# Altium footprint library PART.PcbLib: 407 footprints (part 18 of 26)
Each footprint in its own frame and in the unit in brackets; x right, y up, seen from the top. Pads: shape width x height; smd on the part's side, far side on the other; paste and mask are expansions set on the pad; w line width, h text height; cw(c..) or ccw(c..) is an arc to the next point about the centre after c.
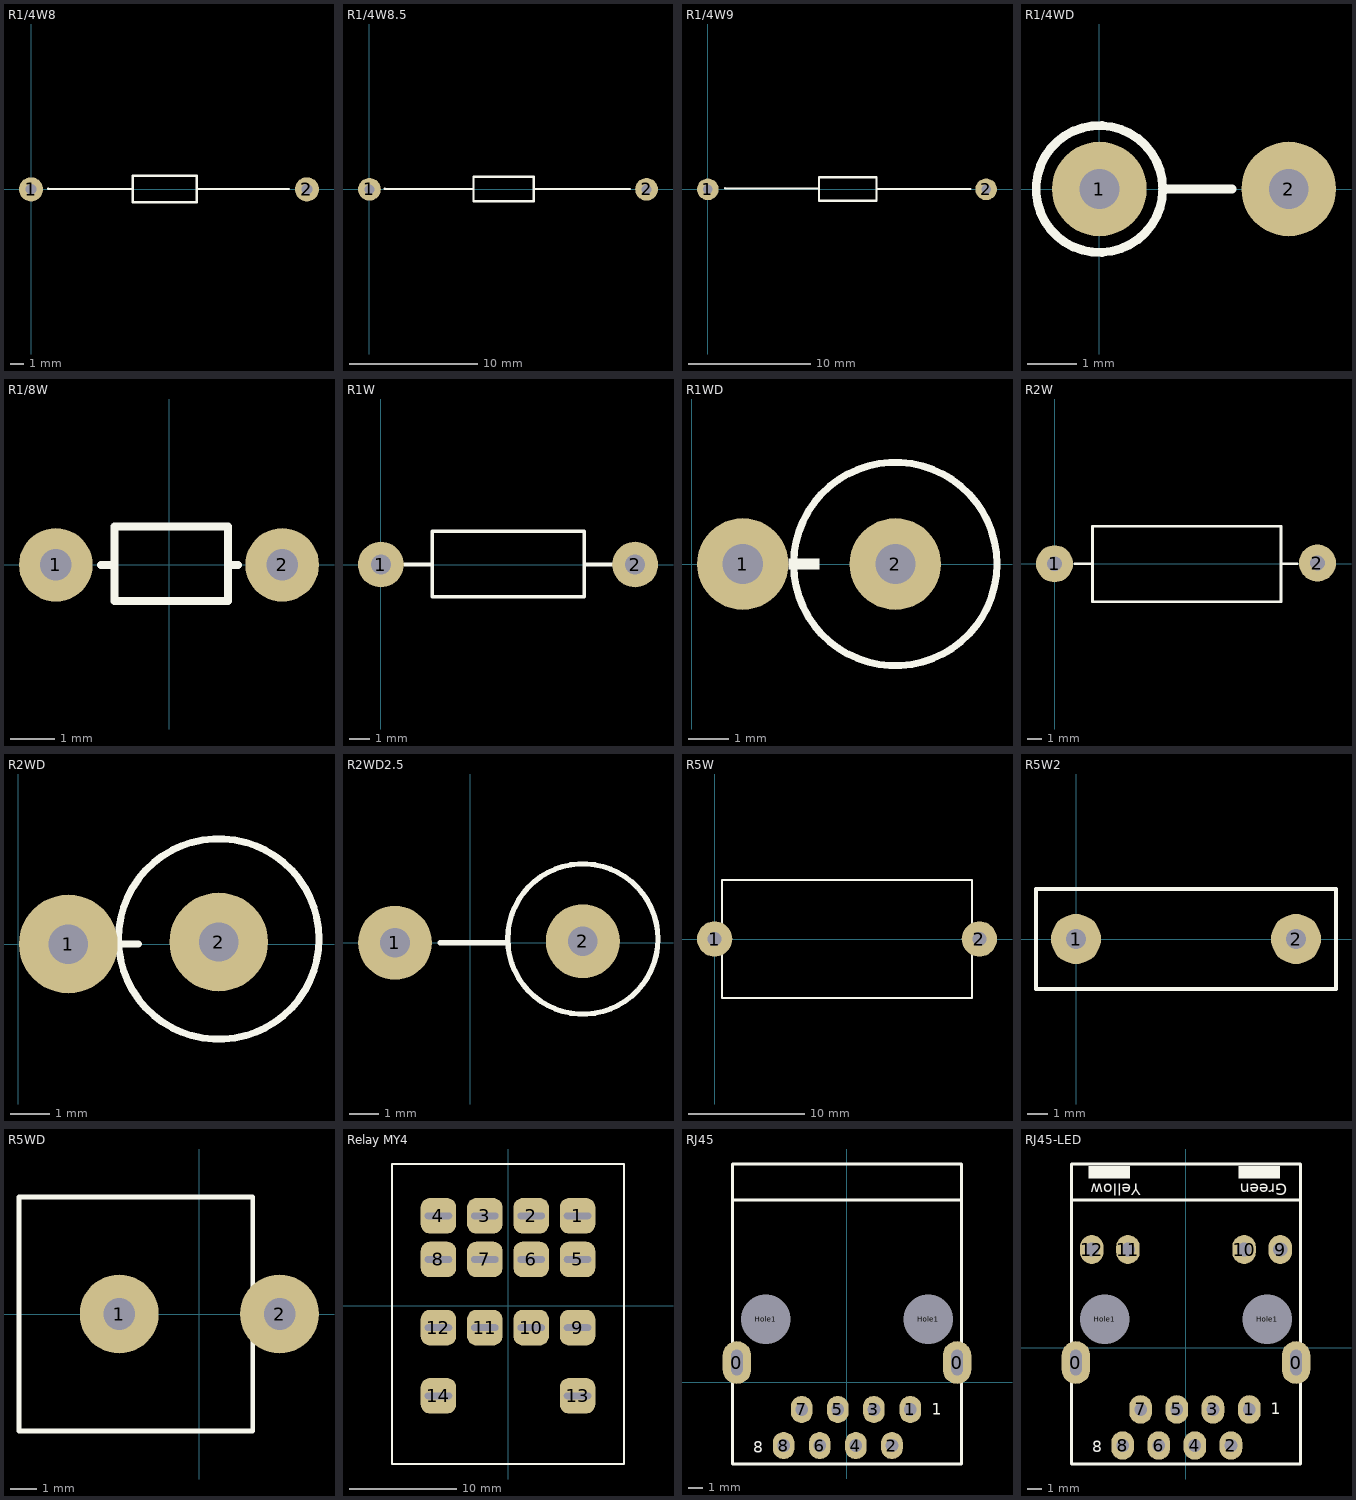
[diagram p17: the footprints below, top view; thin cyan lines are the x and y axes]

## R1/4W8 [mil] "R 1/4W, 2 Pin, 600mil"
height 100
pads (2):
  round 70 hole 31: 1(0,0) 2(800,0)
Top Overlay:
  lines w7: 50,2 295,1 ; 480,1 748,1 ; 295,-37 480,-37 480,39 295,39 295,-37

## R1/4W8.5 [mil] "R 1/4W, 2 Pin, 600mil"
height 100
pads (2):
  round 70 hole 31: 1(0,0) 2(850,0)
Top Overlay:
  lines w7: 47,2.11 319,1 ; 504,1 799,1 ; 319,-37 319,39 504,39 504,-37 319,-37

## R1/4W9 [mil] "R 1/4W, 2 Pin, 600mil"
height 100
pads (2):
  round 70 hole 31: 1(0,0) 2(900,0)
Top Overlay:
  lines w7: 56.01,3.24 360,2 ; 545,1 849,1 ; 360,-37 545,-37 545,39 360,39 360,-37

## R1/4WD [mm] "R 1/4W, 2 Pin, 150mil"
height 2.54
pads (2):
  round 1.905 hole 0.8: 1(0,0) 2(3.81,0)
Top Overlay:
  circle w0.178: c0,0 r1.276
  lines w0.178: 1.27,0 2.667,0
3D body: height 13.42, standoff -4.28, extent -1.778,-1.7 4.322,1.7

## R1/8W [mil] "R 1/8W, 2 pin, 300mil"
height 100
pads (2):
  round 65 hole 28: 1(-100,0) 2(100,0)
Top Overlay:
  lines w7: -60,0 -48,0 ; 54,0 61,0 ; -48,-32 52,-32 52,34 -48,34 -48,-32
3D body: height 86.31, standoff -68.11, extent -135,-35.48 135,37

## R1W [mil] "R 1W, 2 pin, 500mil"
height 100
pads (2):
  round 90 hole 39.37: 1(0,0) 2(500,0)
Top Overlay:
  lines w7: 46,0 101,0 ; 400,0 460,0 ; 101,0 101,65 400,65 400,-63 101,-63 101,0

## R1WD [mil] "R 1W, 2 pin, 500mil"
height 100
pads (2):
  round 90 hole 39.37: 1(50,0) 2(200,0)
Top Overlay:
  circle w7: c200,0 r100
  region: 125,5 125,-5 95,-5 95,5

## R2W [mm] "R2W, 2 pin, 700mil"
height 5.08
pads (2):
  round 2.5 hole 1: 1(0,0) 2(17.755,0.051)
Top Overlay:
  lines w0.178: 1.372,0 2.565,0 ; 15.316,0 16.383,0 ; 2.565,0 2.565,2.54 15.291,2.54 15.291,-2.565 2.565,-2.565 2.565,0
3D body: height 8.3, standoff -2, extent -2.362,-3.327 19.838,3.273

## R2WD [mm] "R2W, 2 pin, 700mil"
height 5.08
pads (2):
  round 2.5 hole 1: 1(1.27,0) 2(5.08,0.051)
Top Overlay:
  circle w0.178: c5.08,0.127 r2.54
  lines w0.178: 2.159,0 3.048,0

## R2WD2.5 [mm] "R2W, 2 pin, 700mil"
height 5.08
pads (2):
  round 2.5 hole 1: 1(-2.54,0) 2(3.81,0.051)
Top Overlay:
  circle w0.178: c3.81,0.127 r2.54
  lines w0.178: -1.016,0 1.27,0

## R5W [mil] "R5W , 2 pin, 400 x 950mil"
height 400
pads (2):
  round 120 hole 47.24: 1(0,0) 2(900,0)
Top Overlay:
  lines w7: 25,-200 875,-200 875,200 25,200 25,-200
3D body: height 362.6, standoff -98.43, extent -84.69,-190 954.68,191.89

## R5W2 [mm] "R5W , 2 pin, 5 x 15mm"
height 10.16
pads (2):
  round 2.5 hole 1: 1(0,0) 2(11,0)
Top Overlay:
  lines w0.178: -2,-2.5 -2,2.5 13,2.5 13,-2.5 -2,-2.5

## R5WD [mm] "R5W , 2 pin, 300 x 600 mil"
height 10.16
pads (2):
  round 3 hole 1.2: 1(-3.048,0) 2(3.048,0)
Top Overlay:
  lines w0.178: -6.858,-4.445 -6.858,4.445 2.032,4.445 2.032,-4.445 -6.858,-4.445

## Relay MY4 [mil] "Relay 4DPDT, 13 pin, 5A"
height 800
pads (14):
  rrect50% 130x130 hole 23.62 slot 100 at 0 deg: 1(255,330) 2(85,330) 3(-85,330) 4(-255,330) 5(255,170) 6(85,170) 7(-85,170) 8(-255,170) 9(255,-80) 10(85,-80) 11(-85,-80) 12(-255,-80) 13(255,-330) 14(-255,-330)
Top Overlay:
  lines w8: -425,-580 425,-580 425,520 -425,520 -425,-580

## RJ45 [mm] "Single Port RJ45 Connector with Intergrated Magetic (LAN) - NonLED"
pads (12):
  oval 2x3 hole 0.8 slot 1.8 at 90 deg: 0(-7.745,1.395) 0(7.745,1.395)
  oval 1.524x1.905 hole 0.9: 1(4.458,-1.905) 2(3.162,-4.445) 3(1.892,-1.905)
  oval 1.524x1.905 hole 0.9 paste+2.54: 4(0.622,-4.445) 5(-0.648,-1.905) 6(-1.918,-4.445) 7(-3.188,-1.905) 8(-4.458,-4.445)
  round 2 hole 3.5 paste+2.54: Hole1(-5.715,4.445) Hole1(5.715,4.445)
Top Overlay:
  lines w0.203: -8.05,12.825 8.05,12.825 ; -8.05,-5.745 -8.05,15.365 8.05,15.365 8.05,-5.745 -8.05,-5.745
  text "8" at -6.604,-4.953 h0.8
  text "1" at 5.969,-2.286 h0.8

## RJ45-LED [mm] "Single Port RJ45 Connector with Intergrated Magetic (LAN) - Tranformer & LED"
pads (16):
  oval 2x3 hole 0.8 slot 1.8 at 90 deg: 0(-7.745,-1.055) 0(7.745,-1.055)
  oval 1.6x2 hole 0.9: 1(4.458,-4.355) 2(3.162,-6.895) 3(1.892,-4.355)
  oval 1.6x2 hole 0.9 paste+2.54: 4(0.622,-6.895) 5(-0.648,-4.355) 6(-1.918,-6.895) 7(-3.188,-4.355) 8(-4.458,-6.895)
  oval 1.651x2.032 hole 1: 9(6.625,6.895) 10(4.085,6.895) 11(-4.085,6.895) 12(-6.625,6.895)
  round 2 hole 3.5 paste+2.54: Hole1(-5.715,1.995) Hole1(5.715,1.995)
Top Overlay:
  rectangle: -6.858,11.901 -3.937,12.79
  rectangle: 3.683,11.901 6.604,12.79
  lines w0.203: -8.05,10.375 8.05,10.375 ; -8.05,-8.195 -8.05,12.915 8.05,12.915 8.05,-8.195 -8.05,-8.195
  text "Yellow" at -3.175,11.52 h0.8
  text "Green" at 7.112,11.52 h0.8
  text "1" at 5.969,-4.699 h0.8
  text "8" at -6.604,-7.366 h0.8